# Altium footprint library Intelliclone.PcbLib: 372 footprints (part 21 of 24)
Each footprint in its own frame and in the unit in brackets; x right, y up, seen from the top. Pads: shape width x height; smd on the part's side, far side on the other; paste and mask are expansions set on the pad; w line width, h text height; cw(c..) or ccw(c..) is an arc to the next point about the centre after c.
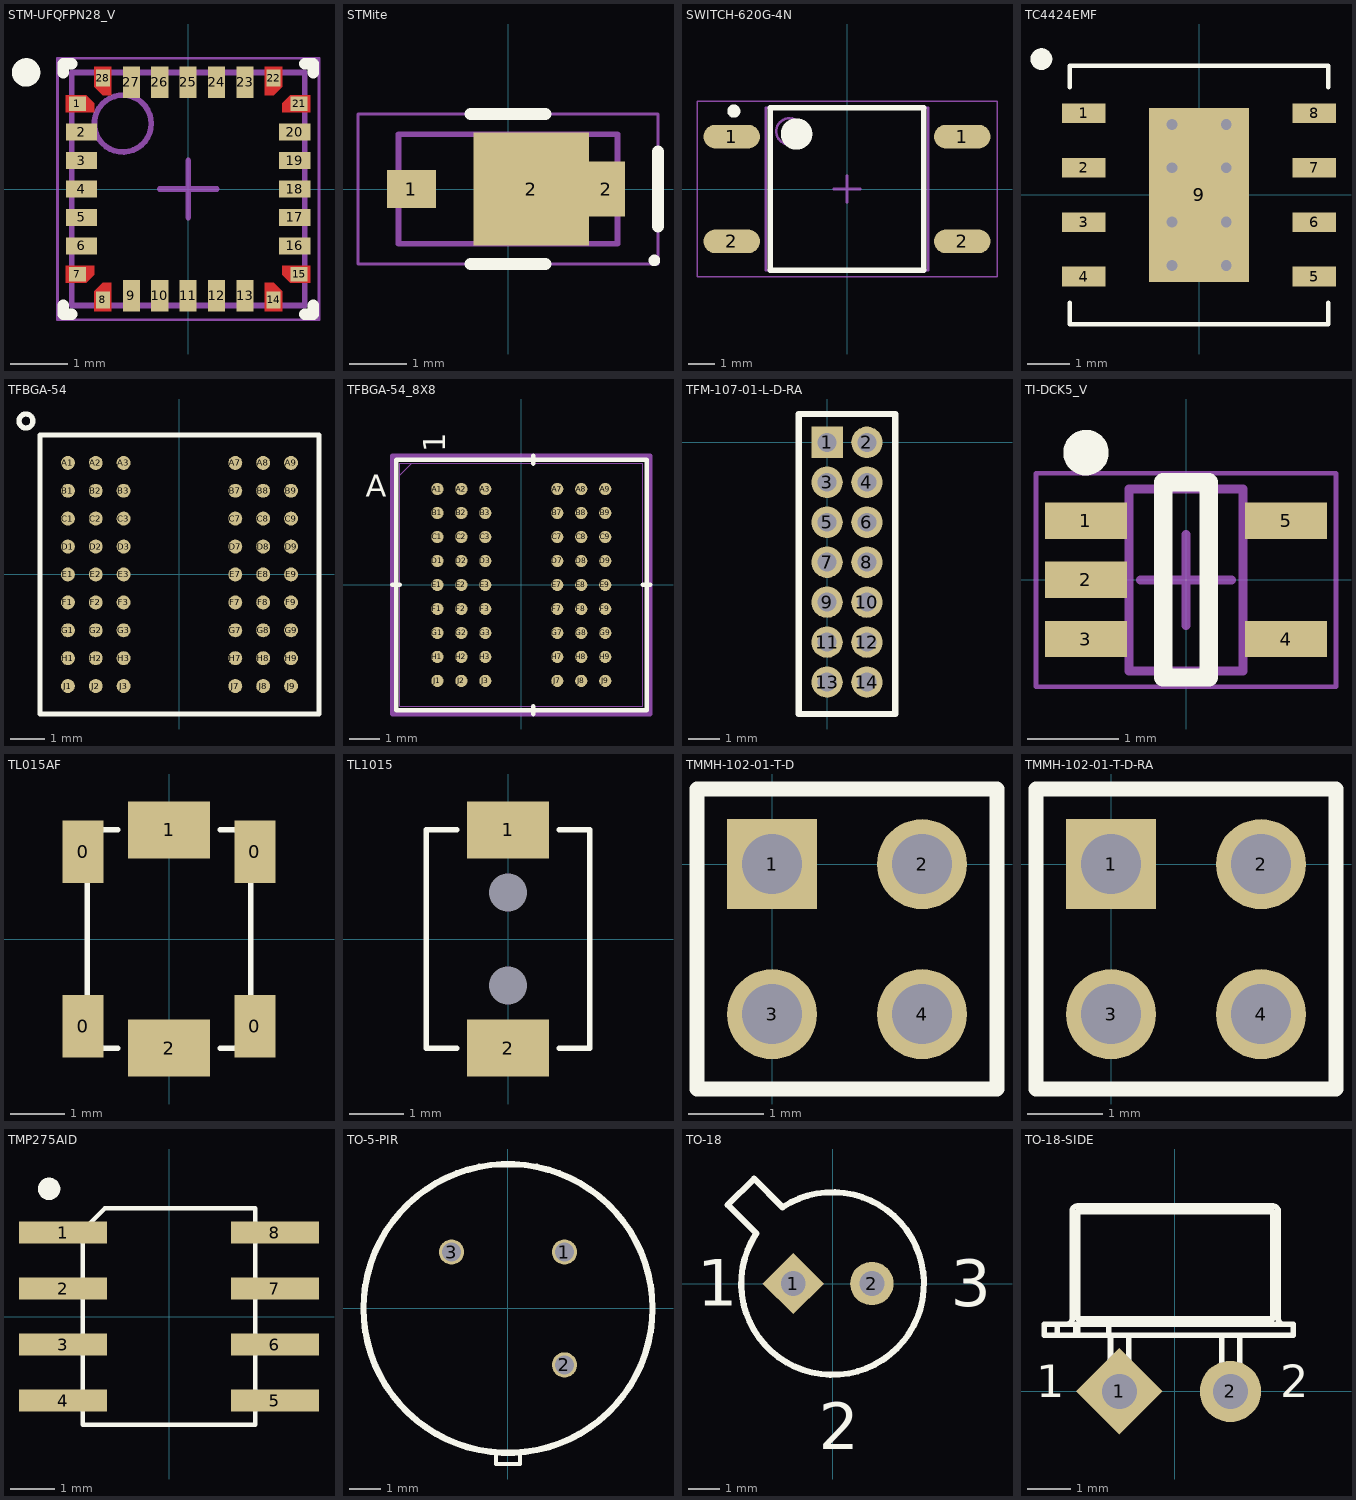
[diagram p20: the footprints below, top view; thin cyan lines are the x and y axes]

## STM-UFQFPN28_V [mm] "QFN, 28-Leads, Body 4.1x4.1mm, Pitch 0.5mm"
height 0.6
pads (28):
  rect 0.3x0.25 smd: 1(-1.95,1.5) 7(-1.95,-1.5) 15(1.95,-1.5) 21(1.95,1.5)
  rect 0.55x0.3 smd: 2(-1.875,1) 3(-1.875,0.5) 4(-1.875,0) 5(-1.875,-0.5) 6(-1.875,-1) 16(1.875,-1) 17(1.875,-0.5) 18(1.875,0) 19(1.875,0.5) 20(1.875,1)
  rect 0.25x0.3 smd: 8(-1.5,-1.95) 14(1.5,-1.95) 22(1.5,1.95) 28(-1.5,1.95)
  rect 0.3x0.55 smd: 9(-1,-1.875) 10(-0.5,-1.875) 11(0,-1.875) 12(0.5,-1.875) 13(1,-1.875) 23(1,1.875) 24(0.5,1.875) 25(0,1.875) 26(-0.5,1.875) 27(-1,1.875)
Top Layer:
  region: -2.15,-1.35 -1.65,-1.35 -1.65,-1.505 -1.795,-1.65 -2.15,-1.65
  region: -1.35,-2.15 -1.35,-1.65 -1.505,-1.65 -1.65,-1.795 -1.65,-2.15
  region: -1.35,2.15 -1.35,1.65 -1.505,1.65 -1.65,1.795 -1.65,2.15
  region: 1.35,-2.15 1.35,-1.65 1.505,-1.65 1.65,-1.795 1.65,-2.15
  region: 2.15,1.35 1.65,1.35 1.65,1.505 1.795,1.65 2.15,1.65
  region: -2.15,1.35 -1.65,1.35 -1.65,1.505 -1.795,1.65 -2.15,1.65
  region: 2.15,-1.35 1.65,-1.35 1.65,-1.505 1.795,-1.65 2.15,-1.65
  region: 1.35,2.15 1.35,1.65 1.505,1.65 1.65,1.795 1.65,2.15
Top Overlay:
  circle w0.25: c-2.85,2.05 r0.125
  lines w0.2: -2.2,-2.047 -2.2,-2.2 -2.047,-2.2 ; -2.2,2.047 -2.2,2.2 -2.047,2.2 ; 2.047,-2.2 2.2,-2.2 2.2,-2.047 ; 2.047,2.2 2.2,2.2 2.2,2.047
Mechanical 13:
  circle w0.1: c-1.15,1.15 r0.5
  lines w0.1: -2.05,-2.05 2.05,-2.05 2.05,2.05 -2.05,2.05 -2.05,-2.05
Mechanical 15:
  lines w0.05: -2.3,-2.3 2.3,-2.3 2.3,2.3 -2.3,2.3 -2.3,-2.3
  lines w0.1: -0.5,0 0.5,0 ; 0,-0.5 0,0.5
3D body: height 0.6, standoff 0, extent -2.05,-2.05 2.05,2.05

## STMite [mm] "STmite Flat package"
height 1
pads (3):
  rect 0.85x0.65 smd: 1(-1.675,0)
  rect 2x1.95 smd: 2(0.4,0)
  rect 0.65x0.95 smd: 2(1.7,0)
Top Overlay:
  circle w0.1: c2.537,-1.237 r0.05
  lines w0.2: -0.65,-1.3 0.65,-1.3 ; -0.65,1.3 0.65,1.3 ; 2.6,-0.65 2.6,0.65
Mechanical 13:
  lines w0.1: -1.9,-0.95 -1.9,0.95 1.9,0.95 1.9,-0.95 -1.9,-0.95
Mechanical 15:
  lines w0.05: -2.6,-1.3 -2.6,1.3 2.6,1.3 2.6,-1.3 -2.6,-1.3
  lines w0.1: -0.5,0 0.5,0 ; 0,-0.5 0,0.5
3D body "User Library-DO216-AA.STEP": height 0.85, standoff 0, extent -1.9,-0.954 1.9,0.955

## SWITCH-620G-4N [mm] "Switch Momentary Pushbutton 6.2mmx6.2mm Gull Lead"
height 2.9
pads (4):
  oval 2.15x0.9 smd: 1(-4.4,2) 1(4.4,2) 2(-4.4,-2) 2(4.4,-2)
Top Overlay:
  circle w0.6: c-1.925,2.1 r0.3
  circle w0.25: c-4.318,2.972 r0.125
  lines w0.2: -2.925,-3.1 2.925,-3.1 2.925,3.1 -2.925,3.1 -2.925,-3.1
Mechanical 13:
  circle w0.1: c-2.2,2.2 r0.5
  lines w0.1: -3.1,-3.1 3.1,-3.1 3.1,3.1 -3.1,3.1 -3.1,-3.1
Mechanical 15:
  lines w0.05: -5.725,-3.35 5.725,-3.35 5.725,3.35 -5.725,3.35 -5.725,-3.35
  lines w0.1: -0.5,0 0.5,0 ; 0,-0.5 0,0.5
3D body "KSC421G70SHLFS.STEP": height 5.11, standoff -0.09, extent -4.945,-3.15 4.946,3.15

## TC4424EMF [mil]
pads (9):
  rect 40x18 smd: 1(-106,75) 2(-106,25) 3(-106,-25) 4(-106,-75) 5(106,-75) 6(106,-25) 7(106,25) 8(106,75)
  rect 92x160 smd: 9(0,0)
via -25,-65 diameter 24 hole 10
via 25,-65 diameter 24 hole 10
via -25,-25 diameter 24 hole 10
via 25,-25 diameter 24 hole 10
via -25,25 diameter 24 hole 10
via 25,25 diameter 24 hole 10
via 25,65 diameter 24 hole 10
via -25,65 diameter 24 hole 10
Top Overlay:
  circle w10: c-145,125 r5
  lines w4.02: -119,-99 -119,-119 119,-119 119,-99 ; -119,99 -119,119 119,119 119,99
3D body: height 38, standoff 2, extent -120,-120 120,120

## TFBGA-54 [mm]
pads (54):
  round 0.4 smd: A1(-3.2,3.2) A2(-2.4,3.2) A3(-1.6,3.2) A7(1.6,3.2) A8(2.4,3.2) A9(3.2,3.2) B1(-3.2,2.4) B2(-2.4,2.4) B3(-1.6,2.4) B7(1.6,2.4) B8(2.4,2.4) B9(3.2,2.4) C1(-3.2,1.6) C2(-2.4,1.6) C3(-1.6,1.6) C7(1.6,1.6) C8(2.4,1.6) C9(3.2,1.6) D1(-3.2,0.8) D2(-2.4,0.8) D3(-1.6,0.8) D7(1.6,0.8) D8(2.4,0.8) D9(3.2,0.8) E1(-3.2,0) E2(-2.4,0) E3(-1.6,0) E7(1.6,0) E8(2.4,0) E9(3.2,0) F1(-3.2,-0.8) F2(-2.4,-0.8) F3(-1.6,-0.8) F7(1.6,-0.8) F8(2.4,-0.8) F9(3.2,-0.8) G1(-3.2,-1.6) G2(-2.4,-1.6) G3(-1.6,-1.6) G7(1.6,-1.6) G8(2.4,-1.6) G9(3.2,-1.6) H1(-3.2,-2.4) H2(-2.4,-2.4) H3(-1.6,-2.4) H7(1.6,-2.4) H8(2.4,-2.4) H9(3.2,-2.4) J1(-3.2,-3.2) J2(-2.4,-3.2) J3(-1.6,-3.2) J7(1.6,-3.2) J8(2.4,-3.2) J9(3.2,-3.2)
Top Overlay:
  circle w0.15: c-4.4,4.4 r0.2
  lines w0.15: -4,-4 4,-4 4,4 -4,4 -4,-4
3D body: height 0.25, standoff 0, extent 0,0 0,0
3D body "TFBGA-54_8X8.stp": height 1.2, standoff 0, extent -3.901,-4.101 4.201,4.001

## TFBGA-54_8X8 [mil]
pads (54):
  round 16 smd paste+0 mask+0: A1(-110.24,125.98) A2(-78.74,125.98) A3(-47.24,125.98) A7(47.24,125.98) A8(78.74,125.98) A9(110.24,125.98) B1(-110.24,94.49) B2(-78.74,94.49) B3(-47.24,94.49) B7(47.24,94.49) B8(78.74,94.49) B9(110.24,94.49) C1(-110.24,62.99) C2(-78.74,62.99) C3(-47.24,62.99) C7(47.24,62.99) C8(78.74,62.99) C9(110.24,62.99) D1(-110.24,31.5) D2(-78.74,31.5) D3(-47.24,31.5) D7(47.24,31.5) D8(78.74,31.5) D9(110.24,31.5) E1(-110.24,0) E2(-78.74,0) E3(-47.24,0) E7(47.24,0) E8(78.74,0) E9(110.24,0) F1(-110.24,-31.5) F2(-78.74,-31.5) F3(-47.24,-31.5) F7(47.24,-31.5) F8(78.74,-31.5) F9(110.24,-31.5) G1(-110.24,-62.99) G2(-78.74,-62.99) G3(-47.24,-62.99) G7(47.24,-62.99) G8(78.74,-62.99) G9(110.24,-62.99) H1(-110.24,-94.49) H2(-78.74,-94.49) H3(-47.24,-94.49) H7(47.24,-94.49) H8(78.74,-94.49) H9(110.24,-94.49) J1(-110.24,-125.98) J2(-78.74,-125.98) J3(-47.24,-125.98) J7(47.24,-125.98) J8(78.74,-125.98) J9(110.24,-125.98)
Top Overlay:
  lines w6: -169.5,0 -159.5,0 ; 15.75,-169.5 15.75,-159.5 ; 15.75,159.5 15.75,169.5 ; 159.5,0 169.5,0 ; -164.5,-164.5 -164.5,164.5 164.5,164.5 164.5,-164.5 -164.5,-164.5
  text "1" at -90.24,174.5 h50
  text "A" at -204.5,105.98 h50
Mechanical 13:
  lines w1: -159.5,143.75 -143.75,159.5 ; -159.5,-159.5 -159.5,159.5 159.5,159.5 159.5,-159.5 -159.5,-159.5
  text "1" at -90.24,174.5 h50
  text "A" at -204.5,105.98 h50
Mechanical 15:
  lines w6: -169.5,-169.5 169.5,-169.5 169.5,169.5 -169.5,169.5 -169.5,-169.5
3D body "TFBGA-54_8X8.stp": height 47.09, standoff 0, extent -159.48,-159.48 159.49,159.49
3D body: height 10, standoff 0, extent 0,0 10,10

## TFM-107-01-L-D-RA [mm] "Sametec TFM-107-01-L-D-RA"
pads (14):
  rect 1x1 hole 0.6: 1(0,0)
  round 1 hole 0.6: 2(1.27,0) 3(0,-1.27) 4(1.27,-1.27) 5(0,-2.54) 6(1.27,-2.54) 7(0,-3.81) 8(1.27,-3.81) 9(0,-5.08) 10(1.27,-5.08) 11(0,-6.35) 12(1.27,-6.35) 13(0,-7.62) 14(1.27,-7.62)
Top Overlay:
  lines w0.2: -0.9,-8.636 -0.9,0.9 2.17,0.9 2.17,-8.636 -0.9,-8.636
3D body "TFM-107-01-L-D-RA.stp": height 3.86, standoff -3.76, extent -6.096,-9.842 1.397,2.223

## TI-DCK5_V [mm] "SOT23, 5-Leads, Body 2x1.25mm, Pitch 0.65mm"
height 1.1
pads (5):
  rect 0.9x0.4 smd: 1(-1.1,0.65) 2(-1.1,0) 3(-1.1,-0.65) 4(1.1,-0.65) 5(1.1,0.65)
Top Overlay:
  circle w0.25: c-1.1,1.4 r0.125
  lines w0.2: -0.25,-1.075 -0.25,1.075 0.25,1.075 0.25,-1.075 -0.25,-1.075
Mechanical 13:
  lines w0.1: -0.625,-1 0.625,-1 0.625,1 -0.625,1 -0.625,-1
Mechanical 15:
  lines w0.05: -1.65,-1.175 1.65,-1.175 1.65,1.175 -1.65,1.175 -1.65,-1.175
  lines w0.1: -0.5,0 0.5,0 ; 0,-0.5 0,0.5
3D body: height 1.1, standoff 0, extent -0.625,-1 0.625,1

## TL015AF [mm] "TL1015 Momentary Tactile Switch"
pads (6):
  rect 0.75x1.15 smd: 0(-1.575,-1.6) 0(-1.575,1.6) 0(1.575,-1.6) 0(1.575,1.6)
  rect 1.5x1.05 smd: 1(0,2) 2(0,-2)
Top Overlay:
  lines w0.102: -1.5,2 -1.5,-2 -0.94,-2 ; -1.5,2.007 -0.94,2.007 ; 0.94,-2 1.5,-2 1.5,2 ; 0.94,2.007 1.5,2.007
3D body "User Library-Sw Tact TL1015.step": height 1.8, standoff 0, extent -1.5,-2.2 1.5,2.2

## TL1015 [mm] "TL1015 Momentary Tactile Switch"
pads (4):
  round 0 hole 0.7 unplated: 0(0,-0.85) 0(0,0.85)
  rect 1.5x1.05 smd: 1(0,2) 2(0,-2)
Top Overlay:
  lines w0.102: -1.5,2 -1.5,-2 -0.94,-2 ; -1.5,2.007 -0.94,2.007 ; 0.94,-2 1.5,-2 1.5,2 ; 0.94,2.007 1.5,2.007
3D body: height 2.25, standoff 0.25, extent -0.992,-0.998 1,0.998
3D body: height 1.5, standoff 0.25, extent -1.5,-2 1.5,2.007
3D body: height 2.25, standoff 1.75, extent -3.735,-2 -1.743,-0.004

## TMMH-102-01-T-D [mm] "Connector; Header; 4 Position"
pads (4):
  rect 1.2x1.2 hole 0.8: 1(0,0)
  round 1.2 hole 0.8: 2(2,0) 3(0,-2) 4(2,-2)
Top Overlay:
  lines w0.2: -1,-2.994 3,-2.994 3,1 -1,1 -1,-2.994
3D body "TMMH-102-01-T-D.stp": height 5.21, standoff -2.46, extent -1,-2.994 3,0.994

## TMMH-102-01-T-D-RA [mm] "Connector; Header; 4 Position, Right Angle"
pads (4):
  rect 1.2x1.2 hole 0.8: 1(0,0)
  round 1.2 hole 0.8: 2(2,0) 3(0,-2) 4(2,-2)
Top Overlay:
  lines w0.2: -1,-2.994 -1,1 3,1 3,-2.994 -1,-2.994
3D body "TMMH-102-01-T-D-RA.stp": height 4.09, standoff -2.51, extent -6.431,-3 2.3,1

## TMP275AID [mil]
height 53.15
pads (8):
  rect 78.7x19.7 smd: 1(-94.5,75) 2(-94.5,25) 3(-94.5,-25) 4(-94.5,-75) 5(94.5,-75) 6(94.5,-25) 7(94.5,25) 8(94.5,75)
Top Overlay:
  circle w10: c-107,114 r5
  lines w4.02: -77,-96.5 77,-96.5 77,96.5 -57.3,96.5 -77,76.8 -77,-96.5
3D body: height 50, standoff 4, extent -78,-96 76,97

## TO-5-PIR [mm]
pads (3):
  round 0.8 hole 0.6: 1(1.796,1.796) 2(1.796,-1.796) 3(-1.796,1.796)
Top Overlay:
  circle w0.203: c0,0 r4.6
  lines w0.127: -0.381,-4.699 -0.381,-4.953 0.381,-4.953 0.381,-4.699
3D body "PYD-1798-3615-00PIR-1.STEP": height 4.5, standoff -1.91, extent -4.6,-5.093 4.6,4.6

## TO-18 [mm] "Can; 2 Leads; Pin Circle Dia. 2.54 mm; Lead Dia. 0.48 mm (max)"
height 5.33
pads (2):
  rect 1.4x1.4 hole 0.8 rot 45: 1(-1.27,0)
  round 1.4 hole 0.8: 2(1.27,0)
Top Overlay:
  lines w0.2: -3.386,2.537 -2.537,3.386 -1.618,2.467 cw(c0,0) -2.467,1.618 -3.386,2.537
  text "1" at -4.38,-0.719 h1.5
  text "2" at -0.443,-5.355 h1.5
  text "3" at 3.812,-0.742 h1.5

## TO-18-SIDE [mm] "Can; 2 Leads; Pin Circle Dia. 2.54 mm; Lead Dia. 0.48 mm (max)"
height 5.33
pads (2):
  rect 1.4x1.4 hole 0.8 rot 45: 1(-1.27,0)
  round 1.4 hole 0.8: 2(1.27,0)
Top Overlay:
  circle w0.127: c1.278,0.009 r0.21
  circle w0.127: c-1.262,0.009 r0.21
  lines w0.127: -2.475,1.533 ccw(c-2.475,1.66) -2.348,1.66 -2.348,4.111 cw(c-2.221,4.111) -2.221,4.238 2.237,4.238 cw(c2.237,4.111) 2.364,4.111 2.364,1.66 ccw(c2.491,1.66) 2.491,1.533 ; -2.27,1.279 -2.27,1.533 ; -2.225,1.279 -2.225,1.533 ; -1.51,4.111 -1.51,4.238 ; -1.507,1.279 -1.507,1.533 ; -1.472,1.279 -1.472,0.009 -1.052,0.009 -1.052,1.279 ; 1.068,1.279 1.068,0.009 1.488,0.009 1.488,1.279 ; 1.526,4.111 1.526,4.238 ; -2.691,1.279 -2.691,1.533 ; -2.691,1.279 2.707,1.279 2.707,1.533 -2.691,1.533 ; -2.691,1.279 -2.989,1.279 -2.989,1.533 -2.691,1.533 ; -2.221,1.66 -2.221,4.111 2.237,4.111 2.237,1.66 -2.221,1.66
  text "1" at -3.175,-0.381 h1.27
  text "2" at 2.413,-0.381 h1.27